# Altium schematic symbol library Minh_Lib.SchLib: 619 symbols (part 3 of 4)
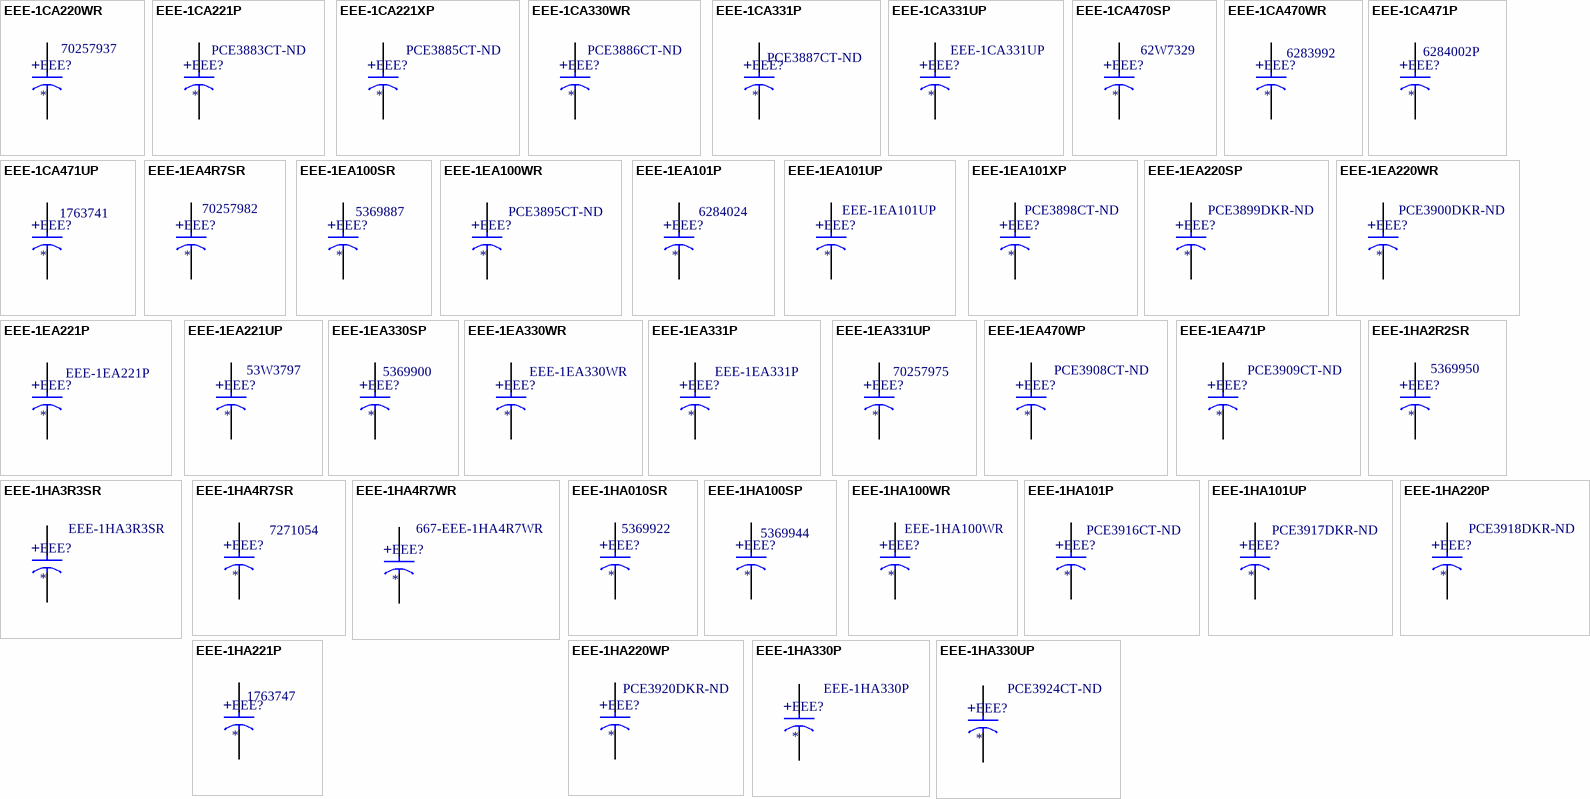
[diagram p17: symbols EEE-1CA220WR to EEE-1HA330UP]

## EEE-1EA4R7SR
designator EEE?  Supplier Part Number 1: 70257982
Aluminum Electrolytic Capacitor, 2000h 4 (Dia) x 5.4mm, 4.7uF 25 VDC, VS Series; Manufacturer: Panasonic; Manufacturer Part Number: EEE-1EA4R7SR; Dielectric Material: Aluminium; Tolerance: 20%; Voltage Rating: 25V; Ripple Current (AC): 22mA; Life (Hours): 2000Hour; Polarity: Polar; Leakage Current: 3uA; Lead Length: 1.8mm; Supplier 1: Allied Electronics; RoHS: Yes; Category: Aluminum Electrolytic Capacitors; Stock 1: 33; Pricing 1: 1=0.14000, 100=0.13300, 200=0.13000, 500=0.12600, 1000=0.12100, 2500=0.11300, 5000=0.10400 (USD); Mount: Surface Mount,PCB; Case/Package: Radial; Number of Pins: 2; Contact Plating: Tin; Min Operating Temperature: -40°C; Max Operating Temperature: 85°C; Capacitance: 4.7uF; Packaging: Tape and Reel; Voltage Rating (DC): 25V; Package Quantity: 2000; Ripple Current: 22mA; Termination: SMD/SMT; Voltage: 25V; Series: S; Construction: Cylindrical; Diameter: 4mm; Length: 5.5mm; Width: 4.3mm; Height: 5.4mm; Height - Seated (Max): 0.213inch; Lead Pitch: 1mm; Radiation Hardening: No; Lead Free: Lead Free; REACH SVHC: Unknown; RoHS Compliant: Yes; ComponentLink1URL: https://datasheet.ciiva.com/11780/0900766b8078636e-11780832.pdf?src-supplier=RSComponents; ComponentLink1Description: https://datasheet.ciiva.com/11780/0900766b8078636e-11780832.pdf?src-supplier=RSComponents; ComponentLink2URL: https://datasheet.ciiva.com/24235/aba0000ce2-40801-24235782.pdf?src-supplier=Mouser; ComponentLink2Description: https://datasheet.ciiva.com/24235/aba0000ce2-40801-24235782.pdf?src-supplier=Mouser; ComponentLink3URL: https://datasheet.ciiva.com/43485/aba0000ce2-43485610.pdf?src-supplier=Farnell; ComponentLink3Description: https://datasheet.ciiva.com/43485/aba0000ce2-43485610.pdf?src-supplier=Farnell; ComponentLink4URL: https://datasheet.ciiva.com/46387/aba0000ce2-46387975.pdf?src-supplier=Element14; ComponentLink4Description: https://datasheet.ciiva.com/46387/aba0000ce2-46387975.pdf?src-supplier=Element14; ComponentLink5URL: https://datasheet.ciiva.com/6196/aba0000ce2-6196252.pdf?src-supplier=Farnell; ComponentLink5Description: https://datasheet.ciiva.com/6196/aba0000ce2-6196252.pdf?src-supplier=Farnell; ComponentLink6URL: https://datasheet.ciiva.com/46376/aba0000ce2-46376367.pdf?src-supplier=Element14; ComponentLink6Description: https://datasheet.ciiva.com/46376/aba0000ce2-46376367.pdf?src-supplier=Element14; ComponentLink7URL: https://datasheet.ciiva.com/2985/aba0000ce2-2985141.pdf?src-supplier=Avnet; ComponentLink7Description: https://datasheet.ciiva.com/2985/aba0000ce2-2985141.pdf?src-supplier=Avnet; ComponentLink8URL: https://datasheet.ciiva.com/15166/getdatasheetpartid-199828-15166365.pdf?src-supplier=Verical; ComponentLink8Description: https://datasheet.ciiva.com/15166/getdatasheetpartid-199828-15166365.pdf?src-supplier=Verical; ComponentLink9URL: https://datasheet.ciiva.com/30114/11aba0000ce2-30114797.pdf?src-supplier=Onlinecomponents.com; ComponentLink9Description: https://datasheet.ciiva.com/30114/11aba0000ce2-30114797.pdf?src-supplier=Onlinecomponents.com; ComponentLink10URL: https://datasheet.ciiva.com/17353/aba0000ce2-17353335.pdf?src-supplier=Avnet+Europe; ComponentLink10Description: https://datasheet.ciiva.com/17353/aba0000ce2-17353335.pdf?src-supplier=Avnet+Europe
footprint CAPACITOR/ALU - SIZE B/SMD - 4X5.4 (CAPACITOR  -  ALUMINIUM - SIZE B / EEEFK - SMD)
pins: 1, 2
text: +

## EEE-1EA100SR
designator EEE?  Supplier Part Number 1: 5369887
Aluminum Electrolytic Capacitor, 2000h 5 (Dia) x 5.4mm, 10uF 25 VDC, VS Series; Manufacturer: Panasonic; Manufacturer Part Number: EEE-1EA100SR; Ripple Current: 28mA; Tolerance: 20%; Voltage Rating: 25V; Life (Hours): 2000Hour; Leakage Current: 3uA; Lead Length: 2.2mm; Supplier 1: RSComponents; RoHS: Yes; Category: Aluminum Electrolytic Capacitors; Stock 1: 1; Pricing 1: 5=0.32700, 50=0.28000, 100=0.25500, 250=0.22200, 500=0.18800 (USD); Mount: Surface Mount,PCB; Case/Package: Radial; Number of Pins: 2; Contact Plating: Tin; Min Operating Temperature: -40°C; Max Operating Temperature: 85°C; Capacitance: 10uF; Packaging: Tape and Reel; Ripple Current (AC): 28mA; Voltage Rating (DC): 25V; Package Quantity: 1; Termination: SMD/SMT; Voltage: 25V; Series: S; Construction: Cylindrical; Diameter: 5mm; Length: 5.5mm; Width: 5.3mm; Height: 5.4mm; Height - Seated (Max): 0.213inch; Lead Pitch: 1.5mm; Radiation Hardening: No; REACH SVHC: No SVHC; RoHS Compliant: Yes; ComponentLink1URL: https://datasheet.ciiva.com/11778/0900766b8078636e-11778389.pdf?src-supplier=RSComponents; ComponentLink1Description: https://datasheet.ciiva.com/11778/0900766b8078636e-11778389.pdf?src-supplier=RSComponents; ComponentLink2URL: https://datasheet.ciiva.com/24069/aba0000ce2-40801-24069004.pdf?src-supplier=Mouser; ComponentLink2Description: https://datasheet.ciiva.com/24069/aba0000ce2-40801-24069004.pdf?src-supplier=Mouser; ComponentLink3URL: https://datasheet.ciiva.com/14604/70255710-14604074.pdf?src-supplier=Allied+Electronics; ComponentLink3Description: https://datasheet.ciiva.com/14604/70255710-14604074.pdf?src-supplier=Allied+Electronics; ComponentLink4URL: https://datasheet.ciiva.com/14599/70255710-14599433.pdf?src-supplier=Allied+Electronics; ComponentLink4Description: https://datasheet.ciiva.com/14599/70255710-14599433.pdf?src-supplier=Allied+Electronics; ComponentLink5URL: https://datasheet.ciiva.com/43485/aba0000ce2-43485611.pdf?src-supplier=Farnell; ComponentLink5Description: https://datasheet.ciiva.com/43485/aba0000ce2-43485611.pdf?src-supplier=Farnell; ComponentLink6URL: https://datasheet.ciiva.com/16432/aba0000ce2-16432888.pdf?src-supplier=Future+Electronics; ComponentLink6Description: https://datasheet.ciiva.com/16432/aba0000ce2-16432888.pdf?src-supplier=Future+Electronics; ComponentLink7URL: https://datasheet.ciiva.com/2985/aba0000ce2-2985103.pdf?src-supplier=Avnet; ComponentLink7Description: https://datasheet.ciiva.com/2985/aba0000ce2-2985103.pdf?src-supplier=Avnet; ComponentLink8URL: https://datasheet.ciiva.com/30215/11aba0000ce2-30215179.pdf?src-supplier=Onlinecomponents.com; ComponentLink8Description: https://datasheet.ciiva.com/30215/11aba0000ce2-30215179.pdf?src-supplier=Onlinecomponents.com; ComponentLink9URL: https://datasheet.ciiva.com/17353/aba0000ce2-17353320.pdf?src-supplier=Avnet+Europe; ComponentLink9Description: https://datasheet.ciiva.com/17353/aba0000ce2-17353320.pdf?src-supplier=Avnet+Europe
footprint CAPACITOR/ALU - SIZE C/SMD - 5X5.4 (CAPACITOR  -  ALUMINIUM - SIZE C / EEEFK - SMD)
pins: 1, 2
text: +

## EEE-1EA100WR
designator EEE?  Supplier Part Number 1: PCE3895CT-ND
Cap Aluminum 10uF 25V 20% (4 X 5.4mm) SMD 22mA 1000 hr 85°C T/R; Manufacturer: Panasonic; Manufacturer Part Number: EEE-1EA100WR; Polarity: Polar; Life (Hours): 1000Hour; Supplier 1: Digi-Key; RoHS: Yes; Category: Aluminum Electrolytic Capacitors; Stock 1: 1; Pricing 1: 1=0.36000, 10=0.25000, 50=0.16660, 100=0.14150, 500=0.09992, 1000=0.08742 (USD); Mount: Surface Mount,PCB; Case/Package: Radial; Contact Plating: Tin; Min Operating Temperature: -40°C; Max Operating Temperature: 85°C; Capacitance: 10uF; Tolerance: 20%; Voltage Rating: 25V; Ripple Current: 22mA; Packaging: Tape and Reel; Package Quantity: 1; Voltage Rating (DC): 25V; Termination: SMD/SMT; Ripple Current (AC): 22mA; Series: S; Construction: Cylindrical; Diameter: 4mm; Length: 5.5mm; Height: 5.4mm; Height - Seated (Max): 0.213inch; Radiation Hardening: No; Lead Free: Lead Free; RoHS Compliant: Yes; REACH SVHC: Unknown; ComponentLink1URL: https://datasheet.ciiva.com/2985/aba0000ce2-2985106.pdf?src-supplier=Avnet; ComponentLink1Description: https://datasheet.ciiva.com/2985/aba0000ce2-2985106.pdf?src-supplier=Avnet; ComponentLink2URL: https://datasheet.ciiva.com/16201/aba0000ce2-16201870.pdf?src-supplier=Future+Electronics; ComponentLink2Description: https://datasheet.ciiva.com/16201/aba0000ce2-16201870.pdf?src-supplier=Future+Electronics; ComponentLink3URL: https://datasheet.ciiva.com/17536/aba0000ce2-17536886.pdf?src-supplier=Avnet+Europe; ComponentLink3Description: https://datasheet.ciiva.com/17536/aba0000ce2-17536886.pdf?src-supplier=Avnet+Europe
footprint CAPACITOR/ALU - SIZE B/SMD - 4X5.4 (CAPACITOR  -  ALUMINIUM - SIZE B / EEEFK - SMD)
pins: 1, 2
text: +

## EEE-1EA101P
designator EEE?  Supplier Part Number 1: 6284024
Cap Aluminum 100uF 25V 20% (8 X 10.2mm) SMD 180mA 2000 hr 85°C T/R; Manufacturer: Panasonic; Manufacturer Part Number: EEE-1EA101P; Life (Hours): 2000Hour; Leakage Current: 3uA; Supplier 1: RSComponents; RoHS: Yes; Category: Aluminum Electrolytic Capacitors; Stock 1: 70; Pricing 1: 5=0.68400, 25=0.48500, 375=0.31900, 1250=0.18300, 1500=0.18000, 5=0.49400, 25=0.35000, 375=0.23000, 1250=0.13200, 1500=0.13000 (USD); Mount: Surface Mount,PCB; Case/Package: Radial; Contact Plating: Tin; Min Operating Temperature: -40°C; Max Operating Temperature: 85°C; Capacitance: 100uF; Tolerance: 20%; Package Quantity: 1; Termination: SMD/SMT; Voltage Rating: 25V; Voltage Rating (DC): 25V; Ripple Current: 180mA; Packaging: Tape and Reel; Voltage: 25V; Ripple Current (AC): 180mA; Series: S; Construction: Cylindrical; Diameter: 8mm; Length: 10.5mm; Height: 10.2mm; Height - Seated (Max): 0.402inch; Radiation Hardening: No; REACH SVHC: Unknown; Lead Free: Lead Free; RoHS Compliant: Yes; ComponentLink1URL: https://datasheet.ciiva.com/11780/0900766b808a016a-11780267.pdf?src-supplier=RSComponents; ComponentLink1Description: https://datasheet.ciiva.com/11780/0900766b808a016a-11780267.pdf?src-supplier=RSComponents; ComponentLink2URL: https://datasheet.ciiva.com/14595/70255710-14595704.pdf?src-supplier=Allied+Electronics; ComponentLink2Description: https://datasheet.ciiva.com/14595/70255710-14595704.pdf?src-supplier=Allied+Electronics; ComponentLink3URL: https://datasheet.ciiva.com/14593/70255710-14593621.pdf?src-supplier=Allied+Electronics; ComponentLink3Description: https://datasheet.ciiva.com/14593/70255710-14593621.pdf?src-supplier=Allied+Electronics; ComponentLink4URL: https://datasheet.ciiva.com/16395/aba0000ce2-16395656.pdf?src-supplier=Future+Electronics; ComponentLink4Description: https://datasheet.ciiva.com/16395/aba0000ce2-16395656.pdf?src-supplier=Future+Electronics; ComponentLink5URL: https://datasheet.ciiva.com/30069/11aba0000ce2-30069578.pdf?src-supplier=Onlinecomponents.com; ComponentLink5Description: https://datasheet.ciiva.com/30069/11aba0000ce2-30069578.pdf?src-supplier=Onlinecomponents.com; ComponentLink6URL: https://datasheet.ciiva.com/17353/aba0000ce2-17353323.pdf?src-supplier=Avnet+Europe; ComponentLink6Description: https://datasheet.ciiva.com/17353/aba0000ce2-17353323.pdf?src-supplier=Avnet+Europe
footprint CAPACITOR/ALU - SIZE F/SMD - 8X10.2 (CAPACITOR  -  ALUMINIUM - SIZE F / EEEFK - SMD)
pins: 1, 2
text: +

## EEE-1EA101UP
designator EEE?  Supplier Part Number 1: EEE-1EA101UP
Cap Aluminum 100uF 25V 20% (8 X 6.2mm) SMD 91mA 2000h 85°C T/R; Manufacturer: Panasonic; Life (Hours): 2000Hour; Leakage Current: 3uA; Dissipation Factor: 0.16%; Supplier 1: Arrow Electronics; Manufacturer Part Number: EEE-1EA101UP; RoHS: Yes; Category: Aluminum Electrolytic Capacitors; Stock 1: 5; Pricing 1: 1=0.48940, 10=0.30340, 25=0.30040 (USD); Mount: Surface Mount,PCB; Case/Package: Radial; Contact Plating: Tin; Min Operating Temperature: -40°C; Max Operating Temperature: 85°C; Capacitance: 100uF; Packaging: Tape and Reel; Ripple Current: 91mA; Tolerance: 20%; Voltage Rating: 25V; Package Quantity: 1; Voltage Rating (DC): 25V; Ripple Current (AC): 91mA; Termination: SMD/SMT; Features: General Purpose; Series: S; Construction: Cylindrical; Diameter: 8mm; Length: 6.2mm; Height: 6.2mm; Height - Seated (Max): 0.244inch; Radiation Hardening: No; REACH SVHC: Unknown; Lead Free: Lead Free; RoHS Compliant: Yes; ComponentLink1URL: https://datasheet.ciiva.com/24072/aba0000ce2-40801-24072437.pdf?src-supplier=Mouser; ComponentLink1Description: https://datasheet.ciiva.com/24072/aba0000ce2-40801-24072437.pdf?src-supplier=Mouser; ComponentLink2URL: https://datasheet.ciiva.com/14606/70255710-14606463.pdf?src-supplier=Allied+Electronics; ComponentLink2Description: https://datasheet.ciiva.com/14606/70255710-14606463.pdf?src-supplier=Allied+Electronics; ComponentLink3URL: https://datasheet.ciiva.com/14598/70255710-14598959.pdf?src-supplier=Allied+Electronics; ComponentLink3Description: https://datasheet.ciiva.com/14598/70255710-14598959.pdf?src-supplier=Allied+Electronics; ComponentLink4URL: https://datasheet.ciiva.com/11680/aba0000ce2-11680591.pdf?src-supplier=Avnet; ComponentLink4Description: https://datasheet.ciiva.com/11680/aba0000ce2-11680591.pdf?src-supplier=Avnet; ComponentLink5URL: https://datasheet.ciiva.com/16507/aba0000ce2-16507708.pdf?src-supplier=Future+Electronics; ComponentLink5Description: https://datasheet.ciiva.com/16507/aba0000ce2-16507708.pdf?src-supplier=Future+Electronics; ComponentLink6URL: https://datasheet.ciiva.com/30221/11aba0000ce2-30221976.pdf?src-supplier=Onlinecomponents.com; ComponentLink6Description: https://datasheet.ciiva.com/30221/11aba0000ce2-30221976.pdf?src-supplier=Onlinecomponents.com; ComponentLink7URL: https://datasheet.ciiva.com/17535/aba0000ce2-17535819.pdf?src-supplier=Avnet+Europe; ComponentLink7Description: https://datasheet.ciiva.com/17535/aba0000ce2-17535819.pdf?src-supplier=Avnet+Europe
footprint CAPACITOR/ALU - SIZE E/SMD - 8X6.2 (CAPACITOR  -  ALUMINIUM - SIZE E / EEEFK - SMD)
pins: 1, 2
text: +

## EEE-1EA101XP
designator EEE?  Supplier Part Number 1: PCE3898CT-ND
Cap Aluminum 100uF 25V 20% (6.3 X 7.7mm) SMD 143mA 2000h 85°C T/R; Manufacturer: Panasonic; Manufacturer Part Number: EEE-1EA101XP; Polarity: Polar; Life (Hours): 2000Hour; Leakage Current: 3uA; Supplier 1: Digi-Key; RoHS: Yes; Category: Aluminum Electrolytic Capacitors; Pricing 1: 1=0.52000, 10=0.36100, 50=0.25240, 100=0.21630 (USD); Mount: Surface Mount,PCB; Case/Package: Radial; Contact Plating: Tin; Min Operating Temperature: -40°C; Max Operating Temperature: 85°C; Capacitance: 100uF; Tolerance: 20%; Voltage Rating (DC): 25V; Ripple Current: 143mA; Packaging: Tape and Reel; Voltage Rating: 25V; Package Quantity: 900; Termination: SMD/SMT; Ripple Current (AC): 143mA; Voltage: 25V; Series: S; Construction: Cylindrical; Diameter: 6.3mm; Length: 8mm; Height: 7.7mm; Height - Seated (Max): 0.303inch; Radiation Hardening: No; Lead Free: Lead Free; RoHS Compliant: Yes; REACH SVHC: Unknown; ComponentLink1URL: https://datasheet.ciiva.com/24022/aba0000ce2-40801-24022875.pdf?src-supplier=Mouser; ComponentLink1Description: https://datasheet.ciiva.com/24022/aba0000ce2-40801-24022875.pdf?src-supplier=Mouser; ComponentLink2URL: https://datasheet.ciiva.com/16201/aba0000ce2-16201065.pdf?src-supplier=Future+Electronics; ComponentLink2Description: https://datasheet.ciiva.com/16201/aba0000ce2-16201065.pdf?src-supplier=Future+Electronics; ComponentLink3URL: https://datasheet.ciiva.com/30108/11aba0000ce2-30108047.pdf?src-supplier=Onlinecomponents.com; ComponentLink3Description: https://datasheet.ciiva.com/30108/11aba0000ce2-30108047.pdf?src-supplier=Onlinecomponents.com; ComponentLink4URL: https://datasheet.ciiva.com/17529/aba0000ce2-17529557.pdf?src-supplier=Avnet+Europe; ComponentLink4Description: https://datasheet.ciiva.com/17529/aba0000ce2-17529557.pdf?src-supplier=Avnet+Europe
footprint CAPACITOR/ALU - SIZE D8/SMD - 6.3X7.7 (CAPACITOR  -  ALUMINIUM - SIZE D8 / EEEFK - SMD)
pins: 1, 2
text: +

## EEE-1EA220SP
designator EEE?  Supplier Part Number 1: PCE3899DKR-ND
Cap Aluminum 22uF 25V 20% (6.3 X 5.4mm) SMD 55mA 2000 hr 85°C T/R; Manufacturer: Panasonic; Manufacturer Part Number: EEE-1EA220SP; Dielectric Material: Aluminium; Life (Hours): 2000Hour; Leakage Current: 3uA; Lead Length: 2.6mm; Supplier 1: Digi-Key; RoHS: Yes; Category: Aluminum Electrolytic Capacitors; Pricing 1: 1=0.38000, 10=0.26400, 50=0.18520, 100=0.15870, 500=0.11902 (USD); Mount: Surface Mount,PCB; Case/Package: Radial; Number of Pins: 2; Contact Plating: Tin; Min Operating Temperature: -40°C; Max Operating Temperature: 85°C; Packaging: Tape and Reel; Capacitance: 22uF; Tolerance: 20%; Ripple Current: 55mA; Voltage Rating: 25V; Ripple Current (AC): 55mA; Voltage Rating (DC): 25V; Package Quantity: 1; Termination: SMD/SMT; Voltage: 25V; Series: S; Construction: Cylindrical; Diameter: 6.3mm; Length: 5.5mm; Width: 6.6mm; Height: 5.4mm; Height - Seated (Max): 0.213inch; Lead Pitch: 1.8mm; Radiation Hardening: No; REACH SVHC: No SVHC; Lead Free: Lead Free; RoHS Compliant: Yes; ComponentLink1URL: https://datasheet.ciiva.com/11778/0900766b8078636e-11778778.pdf?src-supplier=RSComponents; ComponentLink1Description: https://datasheet.ciiva.com/11778/0900766b8078636e-11778778.pdf?src-supplier=RSComponents; ComponentLink2URL: https://datasheet.ciiva.com/24026/aba0000ce2-40801-24026222.pdf?src-supplier=Mouser; ComponentLink2Description: https://datasheet.ciiva.com/24026/aba0000ce2-40801-24026222.pdf?src-supplier=Mouser; ComponentLink3URL: https://datasheet.ciiva.com/14594/70255710-14594571.pdf?src-supplier=Allied+Electronics; ComponentLink3Description: https://datasheet.ciiva.com/14594/70255710-14594571.pdf?src-supplier=Allied+Electronics; ComponentLink4URL: https://datasheet.ciiva.com/14600/70255710-14600425.pdf?src-supplier=Allied+Electronics; ComponentLink4Description: https://datasheet.ciiva.com/14600/70255710-14600425.pdf?src-supplier=Allied+Electronics; ComponentLink5URL: https://datasheet.ciiva.com/43485/aba0000ce2-43485612.pdf?src-supplier=Farnell; ComponentLink5Description: https://datasheet.ciiva.com/43485/aba0000ce2-43485612.pdf?src-supplier=Farnell; ComponentLink6URL: https://datasheet.ciiva.com/7903/aba0000ce2-7903178.pdf?src-supplier=Element14; ComponentLink6Description: https://datasheet.ciiva.com/7903/aba0000ce2-7903178.pdf?src-supplier=Element14; ComponentLink7URL: https://datasheet.ciiva.com/15166/getdatasheetpartid-169276-15166155.pdf?src-supplier=Verical; ComponentLink7Description: https://datasheet.ciiva.com/15166/getdatasheetpartid-169276-15166155.pdf?src-supplier=Verical; ComponentLink8URL: https://datasheet.ciiva.com/2985/aba0000ce2-2985115.pdf?src-supplier=Avnet; ComponentLink8Description: https://datasheet.ciiva.com/2985/aba0000ce2-2985115.pdf?src-supplier=Avnet; ComponentLink9URL: https://datasheet.ciiva.com/17353/aba0000ce2-17353325.pdf?src-supplier=Avnet+Europe; ComponentLink9Description: https://datasheet.ciiva.com/17353/aba0000ce2-17353325.pdf?src-supplier=Avnet+Europe
footprint CAPACITOR/ALU - SIZE D/SMD - 6.3X5.4 (CAPACITOR  -  ALUMINIUM - SIZE D / EEEFK - SMD)
pins: 1, 2
text: +

## EEE-1EA220WR
designator EEE?  Supplier Part Number 1: PCE3900DKR-ND
Cap Aluminum 22uF 25V 20% (5 X 5.4mm) SMD 35mA 1000h 85°C T/R; Manufacturer: Panasonic; Manufacturer Part Number: EEE-1EA220WR; Leakage Current: 3uA; Life (Hours): 1000Hour; Supplier 1: Digi-Key; RoHS: Yes; Category: Aluminum Electrolytic Capacitors; Pricing 1: 1=0.35000, 10=0.24400, 50=0.17060, 100=0.14630, 500=0.10972 (USD); Mount: Surface Mount,PCB; Case/Package: Radial; Contact Plating: Tin; Min Operating Temperature: -40°C; Max Operating Temperature: 85°C; Capacitance: 22uF; Tolerance: 20%; Voltage Rating (DC): 25V; Packaging: Tape and Reel; Package Quantity: 1; Voltage Rating: 25V; Ripple Current: 35mA; Ripple Current (AC): 35mA; Termination: SMD/SMT; Voltage: 25V; Series: S; Construction: Cylindrical; Diameter: 5mm; Length: 5.5mm; Height: 5.4mm; Height - Seated (Max): 0.213inch; Radiation Hardening: No; REACH SVHC: No SVHC; Lead Free: Lead Free; RoHS Compliant: Yes; ComponentLink1URL: https://datasheet.ciiva.com/43470/aba0000ce2-43470652.pdf?src-supplier=Farnell; ComponentLink1Description: https://datasheet.ciiva.com/43470/aba0000ce2-43470652.pdf?src-supplier=Farnell; ComponentLink2URL: https://datasheet.ciiva.com/46378/aba0000ce2-46378298.pdf?src-supplier=Element14; ComponentLink2Description: https://datasheet.ciiva.com/46378/aba0000ce2-46378298.pdf?src-supplier=Element14; ComponentLink3URL: https://datasheet.ciiva.com/46374/aba0000ce2-46374396.pdf?src-supplier=Element14; ComponentLink3Description: https://datasheet.ciiva.com/46374/aba0000ce2-46374396.pdf?src-supplier=Element14; ComponentLink4URL: https://datasheet.ciiva.com/14597/70255710-14597294.pdf?src-supplier=Allied+Electronics; ComponentLink4Description: https://datasheet.ciiva.com/14597/70255710-14597294.pdf?src-supplier=Allied+Electronics; ComponentLink5URL: https://datasheet.ciiva.com/11681/aba0000ce2-11681019.pdf?src-supplier=Avnet; ComponentLink5Description: https://datasheet.ciiva.com/11681/aba0000ce2-11681019.pdf?src-supplier=Avnet; ComponentLink6URL: https://datasheet.ciiva.com/16432/aba0000ce2-16432889.pdf?src-supplier=Future+Electronics; ComponentLink6Description: https://datasheet.ciiva.com/16432/aba0000ce2-16432889.pdf?src-supplier=Future+Electronics; ComponentLink7URL: https://datasheet.ciiva.com/17353/aba0000ce2-17353327.pdf?src-supplier=Avnet+Europe; ComponentLink7Description: https://datasheet.ciiva.com/17353/aba0000ce2-17353327.pdf?src-supplier=Avnet+Europe; ComponentLink8URL: https://datasheet.ciiva.com/16539/aba0000ce2-16539941.pdf?src-supplier=Avnet+Asia; ComponentLink8Description: https://datasheet.ciiva.com/16539/aba0000ce2-16539941.pdf?src-supplier=Avnet+Asia
footprint CAPACITOR/ALU - SIZE C/SMD - 5X5.4 (CAPACITOR  -  ALUMINIUM - SIZE C / EEEFK - SMD)
pins: 1, 2
text: +

## EEE-1EA221P
designator EEE?  Supplier Part Number 1: EEE-1EA221P
Cap Aluminum 220uF 25V 20% (10 X 10.2mm) SMD 310mA 2000h 85 T/R; Manufacturer: Panasonic; Dielectric Material: Aluminium; Life (Hours): 2000Hour; Leakage Current: 55uA; Supplier 1: Arrow Electronics; Manufacturer Part Number: EEE-1EA221P; RoHS: Yes; Category: Aluminum Electrolytic Capacitors; Stock 1: 16; Pricing 1: 1=0.61300, 10=0.39480 (USD); Mount: Surface Mount,PCB; Case/Package: Radial; Contact Plating: Tin; Min Operating Temperature: -40°C; Max Operating Temperature: 85°C; Capacitance: 220uF; Voltage Rating: 25V; Tolerance: 20%; Ripple Current: 310mA; Packaging: Tape and Reel; Package Quantity: 1; Voltage Rating (DC): 25V; Termination: SMD/SMT; Ripple Current (AC): 310mA; Voltage: 25V; Series: S; Construction: Cylindrical; Diameter: 10mm; Length: 10.5mm; Height: 10.2mm; Height - Seated (Max): 0.402inch; Radiation Hardening: No; Lead Free: Lead Free; RoHS Compliant: Yes; REACH SVHC: Unknown; ComponentLink1URL: https://datasheet.ciiva.com/30070/aba0000ce2-30070192.pdf?src-supplier=Onlinecomponents.com; ComponentLink1Description: https://datasheet.ciiva.com/30070/aba0000ce2-30070192.pdf?src-supplier=Onlinecomponents.com; ComponentLink2URL: https://datasheet.ciiva.com/24071/aba0000ce2-40801-24071546.pdf?src-supplier=Mouser; ComponentLink2Description: https://datasheet.ciiva.com/24071/aba0000ce2-40801-24071546.pdf?src-supplier=Mouser; ComponentLink3URL: https://datasheet.ciiva.com/43470/aba0000ce2-43470653.pdf?src-supplier=Farnell; ComponentLink3Description: https://datasheet.ciiva.com/43470/aba0000ce2-43470653.pdf?src-supplier=Farnell; ComponentLink4URL: https://datasheet.ciiva.com/14605/70255710-14605518.pdf?src-supplier=Allied+Electronics; ComponentLink4Description: https://datasheet.ciiva.com/14605/70255710-14605518.pdf?src-supplier=Allied+Electronics; ComponentLink5URL: https://datasheet.ciiva.com/46378/aba0000ce2-46378297.pdf?src-supplier=Element14; ComponentLink5Description: https://datasheet.ciiva.com/46378/aba0000ce2-46378297.pdf?src-supplier=Element14; ComponentLink6URL: https://datasheet.ciiva.com/14602/70255710-14602427.pdf?src-supplier=Allied+Electronics; ComponentLink6Description: https://datasheet.ciiva.com/14602/70255710-14602427.pdf?src-supplier=Allied+Electronics; ComponentLink7URL: https://datasheet.ciiva.com/46374/aba0000ce2-46374395.pdf?src-supplier=Element14; ComponentLink7Description: https://datasheet.ciiva.com/46374/aba0000ce2-46374395.pdf?src-supplier=Element14; ComponentLink8URL: https://datasheet.ciiva.com/2985/aba0000ce2-2985119.pdf?src-supplier=Avnet; ComponentLink8Description: https://datasheet.ciiva.com/2985/aba0000ce2-2985119.pdf?src-supplier=Avnet; ComponentLink9URL: https://datasheet.ciiva.com/31414/aba0000ce2-31414661.pdf?src-supplier=Farnell; ComponentLink9Description: https://datasheet.ciiva.com/31414/aba0000ce2-31414661.pdf?src-supplier=Farnell
footprint CAPACITOR/ALU - SIZE G/SMD - 10X10.2 (CAPACITOR  -  ALUMINIUM - SIZE G / EEEFK - SMD)
pins: 1, 2
text: +

## EEE-1EA221UP
designator EEE?  Supplier Part Number 1: 53W3797
Cap Aluminum 220uF 25V 20% (8 X 10.2mm) SMD 230mA 2000h 85°C T/R; Manufacturer: Panasonic; Manufacturer Part Number: EEE-1EA221UP; Leakage Current: 3uA; Life (Hours): 2000Hour; Supplier 1: Newark; RoHS: Yes; Category: Aluminum Electrolytic Capacitors; Stock 1: 36; Pricing 1: 1=0.76200, 10=0.54900, 25=0.48900, 50=0.42900, 100=0.36900 (USD); Mount: Surface Mount,PCB; Case/Package: Radial; Contact Plating: Tin; Min Operating Temperature: -40°C; Max Operating Temperature: 85°C; Capacitance: 220uF; Tolerance: 20%; Ripple Current: 230mA; Packaging: Tape and Reel; Voltage Rating: 25V; Voltage Rating (DC): 25V; Package Quantity: 1; Ripple Current (AC): 230mA; Termination: SMD/SMT; Voltage: 25V; Series: S; Construction: Cylindrical; Diameter: 8mm; Length: 10.5mm; Height: 10.2mm; Height - Seated (Max): 0.402inch; Radiation Hardening: No; REACH SVHC: Unknown; Lead Free: Lead Free; RoHS Compliant: Yes; ComponentLink1URL: https://datasheet.ciiva.com/14595/70255710-14595429.pdf?src-supplier=Allied+Electronics; ComponentLink1Description: https://datasheet.ciiva.com/14595/70255710-14595429.pdf?src-supplier=Allied+Electronics; ComponentLink2URL: https://datasheet.ciiva.com/14609/70255710-14609039.pdf?src-supplier=Allied+Electronics; ComponentLink2Description: https://datasheet.ciiva.com/14609/70255710-14609039.pdf?src-supplier=Allied+Electronics; ComponentLink3URL: https://datasheet.ciiva.com/10331/aba0000ce2-10331004.pdf?src-supplier=Avnet; ComponentLink3Description: https://datasheet.ciiva.com/10331/aba0000ce2-10331004.pdf?src-supplier=Avnet; ComponentLink4URL: https://datasheet.ciiva.com/15166/getdatasheetpartid-178441-15166199.pdf?src-supplier=Verical; ComponentLink4Description: https://datasheet.ciiva.com/15166/getdatasheetpartid-178441-15166199.pdf?src-supplier=Verical; ComponentLink5URL: https://datasheet.ciiva.com/2985/aba0000ce2-2985122.pdf?src-supplier=Avnet; ComponentLink5Description: https://datasheet.ciiva.com/2985/aba0000ce2-2985122.pdf?src-supplier=Avnet; ComponentLink6URL: https://datasheet.ciiva.com/30176/11aba0000ce2-30176345.pdf?src-supplier=Onlinecomponents.com; ComponentLink6Description: https://datasheet.ciiva.com/30176/11aba0000ce2-30176345.pdf?src-supplier=Onlinecomponents.com
footprint CAPACITOR/ALU - SIZE F/SMD - 8X10.2 (CAPACITOR  -  ALUMINIUM - SIZE F / EEEFK - SMD)
pins: 1, 2
text: +

## EEE-1EA330SP
designator EEE?  Supplier Part Number 1: 5369900
Cap Aluminum 33uF 25V 20% (6.3 X 5.4mm) SMD 65mA 2000h 85 C T/R; Manufacturer: Panasonic; Manufacturer Part Number: EEE-1EA330SP; Dielectric Material: Aluminium; Life (Hours): 2000Hour; Leakage Current: 3uA; Lead Length: 2.6mm; Supplier 1: RSComponents; RoHS: Yes; Category: Aluminum Electrolytic Capacitors; Stock 1: 430; Pricing 1: 5=0.36000, 50=0.26000, 250=0.15000, 500=0.11600, 2500=0.08000, 5=0.26000, 50=0.18800, 250=0.10800, 500=0.08400, 2500=0.05800 (USD); Mount: Surface Mount,PCB; Case/Package: Radial; Number of Pins: 2; Contact Plating: Tin; Min Operating Temperature: -40°C; Max Operating Temperature: 85°C; Capacitance: 33uF; Voltage Rating: 25V; Tolerance: 20%; Ripple Current: 65mA; Packaging: Tape and Reel; Package Quantity: 1; Voltage Rating (DC): 25V; Ripple Current (AC): 65mA; Termination: SMD/SMT; Voltage: 25V; Series: S; Construction: Cylindrical; Diameter: 6.3mm; Length: 5.5mm; Width: 6.6mm; Height: 5.4mm; Height - Seated (Max): 0.213inch; Lead Pitch: 1.8mm; Radiation Hardening: No; REACH SVHC: No SVHC; Lead Free: Lead Free; RoHS Compliant: Yes; ComponentLink1URL: https://datasheet.ciiva.com/11779/0900766b8078636e-11779225.pdf?src-supplier=RSComponents; ComponentLink1Description: https://datasheet.ciiva.com/11779/0900766b8078636e-11779225.pdf?src-supplier=RSComponents; ComponentLink2URL: https://datasheet.ciiva.com/28678/aba0000ce2-28678808.pdf?src-supplier=Element14; ComponentLink2Description: https://datasheet.ciiva.com/28678/aba0000ce2-28678808.pdf?src-supplier=Element14; ComponentLink3URL: https://datasheet.ciiva.com/24027/aba0000ce2-40801-24027482.pdf?src-supplier=Mouser; ComponentLink3Description: https://datasheet.ciiva.com/24027/aba0000ce2-40801-24027482.pdf?src-supplier=Mouser; ComponentLink4URL: https://datasheet.ciiva.com/14599/70255710-14599030.pdf?src-supplier=Allied+Electronics; ComponentLink4Description: https://datasheet.ciiva.com/14599/70255710-14599030.pdf?src-supplier=Allied+Electronics; ComponentLink5URL: https://datasheet.ciiva.com/43485/aba0000ce2-43485613.pdf?src-supplier=Farnell; ComponentLink5Description: https://datasheet.ciiva.com/43485/aba0000ce2-43485613.pdf?src-supplier=Farnell; ComponentLink6URL: https://datasheet.ciiva.com/46387/aba0000ce2-46387973.pdf?src-supplier=Element14; ComponentLink6Description: https://datasheet.ciiva.com/46387/aba0000ce2-46387973.pdf?src-supplier=Element14; ComponentLink7URL: https://datasheet.ciiva.com/6012/aba0000ce2-6012728.pdf?src-supplier=Farnell; ComponentLink7Description: https://datasheet.ciiva.com/6012/aba0000ce2-6012728.pdf?src-supplier=Farnell; ComponentLink8URL: https://datasheet.ciiva.com/2985/aba0000ce2-2985125.pdf?src-supplier=Avnet; ComponentLink8Description: https://datasheet.ciiva.com/2985/aba0000ce2-2985125.pdf?src-supplier=Avnet; ComponentLink9URL: https://datasheet.ciiva.com/16396/aba0000ce2-16396863.pdf?src-supplier=Future+Electronics; ComponentLink9Description: https://datasheet.ciiva.com/16396/aba0000ce2-16396863.pdf?src-supplier=Future+Electronics; ComponentLink10URL: https://datasheet.ciiva.com/15166/getdatasheetpartid-191538-15166317.pdf?src-supplier=Verical; ComponentLink10Description: https://datasheet.ciiva.com/15166/getdatasheetpartid-191538-15166317.pdf?src-supplier=Verical; ComponentLink11URL: https://datasheet.ciiva.com/30152/11aba0000ce2-30152879.pdf?src-supplier=Onlinecomponents.com; ComponentLink11Description: https://datasheet.ciiva.com/30152/11aba0000ce2-30152879.pdf?src-supplier=Onlinecomponents.com; ComponentLink12URL: https://datasheet.ciiva.com/17353/aba0000ce2-17353333.pdf?src-supplier=Avnet+Europe; ComponentLink12Description: https://datasheet.ciiva.com/17353/aba0000ce2-17353333.pdf?src-supplier=Avnet+Europe; ComponentLink13URL: https://datasheet.ciiva.com/16539/aba0000ce2-16539943.pdf?src-supplier=Avnet+Asia; ComponentLink13Description: https://datasheet.ciiva.com/16539/aba0000ce2-16539943.pdf?src-supplier=Avnet+Asia
footprint CAPACITOR/ALU - SIZE D/SMD - 6.3X5.4 (CAPACITOR  -  ALUMINIUM - SIZE D / EEEFK - SMD)
pins: 1, 2
text: +

## EEE-1EA330WR
designator EEE?  Supplier Part Number 1: EEE-1EA330WR
Cap Aluminum 33uF 25V 20% (5 X 5.4mm) SMD 42mA 1000 hr 85°C T/R; Manufacturer: Panasonic; Dielectric Material: Aluminium; Life (Hours): 1000Hour; Leakage Current: 8.2uA; Polarity: Polar; Supplier 1: Arrow Electronics; Manufacturer Part Number: EEE-1EA330WR; RoHS: Yes; Category: Aluminum Electrolytic Capacitors; Stock 1: 20; Pricing 1: 1=0.30350, 10=0.21690 (USD); Mount: Surface Mount,PCB; Case/Package: Radial; Min Operating Temperature: -40°C; Max Operating Temperature: 85°C; Capacitance: 33uF; Packaging: Tape and Reel; Ripple Current: 42mA; Tolerance: 20%; Voltage Rating: 25V; Package Quantity: 1000; Termination: SMD/SMT; Voltage Rating (DC): 25V; Ripple Current (AC): 42mA; Voltage: 25V; Series: S; Construction: Cylindrical; Diameter: 5mm; Length: 5.5mm; Height: 5.4mm; Height - Seated (Max): 0.213inch; Radiation Hardening: No; REACH SVHC: No SVHC; Lead Free: Lead Free; RoHS Compliant: Yes; ComponentLink1URL: https://datasheet.ciiva.com/43470/aba0000ce2-43470655.pdf?src-supplier=Farnell; ComponentLink1Description: https://datasheet.ciiva.com/43470/aba0000ce2-43470655.pdf?src-supplier=Farnell; ComponentLink2URL: https://datasheet.ciiva.com/46378/aba0000ce2-46378295.pdf?src-supplier=Element14; ComponentLink2Description: https://datasheet.ciiva.com/46378/aba0000ce2-46378295.pdf?src-supplier=Element14; ComponentLink3URL: https://datasheet.ciiva.com/31414/aba0000ce2-31414663.pdf?src-supplier=Farnell; ComponentLink3Description: https://datasheet.ciiva.com/31414/aba0000ce2-31414663.pdf?src-supplier=Farnell; ComponentLink4URL: https://datasheet.ciiva.com/46374/aba0000ce2-46374393.pdf?src-supplier=Element14; ComponentLink4Description: https://datasheet.ciiva.com/46374/aba0000ce2-46374393.pdf?src-supplier=Element14; ComponentLink5URL: https://datasheet.ciiva.com/24027/aba0000ce2-40801-24027319.pdf?src-supplier=Mouser; ComponentLink5Description: https://datasheet.ciiva.com/24027/aba0000ce2-40801-24027319.pdf?src-supplier=Mouser; ComponentLink6URL: https://datasheet.ciiva.com/14605/70255710-14605574.pdf?src-supplier=Allied+Electronics; ComponentLink6Description: https://datasheet.ciiva.com/14605/70255710-14605574.pdf?src-supplier=Allied+Electronics; ComponentLink7URL: https://datasheet.ciiva.com/14603/70255710-14603753.pdf?src-supplier=Allied+Electronics; ComponentLink7Description: https://datasheet.ciiva.com/14603/70255710-14603753.pdf?src-supplier=Allied+Electronics; ComponentLink8URL: https://datasheet.ciiva.com/2985/aba0000ce2-2985128.pdf?src-supplier=Avnet; ComponentLink8Description: https://datasheet.ciiva.com/2985/aba0000ce2-2985128.pdf?src-supplier=Avnet; ComponentLink9URL: https://datasheet.ciiva.com/17076/aba0000ce2-17076760.pdf?src-supplier=Future+Electronics; ComponentLink9Description: https://datasheet.ciiva.com/17076/aba0000ce2-17076760.pdf?src-supplier=Future+Electronics; ComponentLink10URL: https://datasheet.ciiva.com/2985/aba0000ce2-2985129.pdf?src-supplier=Avnet; ComponentLink10Description: https://datasheet.ciiva.com/2985/aba0000ce2-2985129.pdf?src-supplier=Avnet; ComponentLink11URL: https://datasheet.ciiva.com/30071/11aba0000ce2-30071998.pdf?src-supplier=Onlinecomponents.com; ComponentLink11Description: https://datasheet.ciiva.com/30071/11aba0000ce2-30071998.pdf?src-supplier=Onlinecomponents.com; ComponentLink12URL: https://datasheet.ciiva.com/17536/aba0000ce2-17536502.pdf?src-supplier=Avnet+Europe; ComponentLink12Description: https://datasheet.ciiva.com/17536/aba0000ce2-17536502.pdf?src-supplier=Avnet+Europe
footprint CAPACITOR/ALU - SIZE C/SMD - 5X5.4 (CAPACITOR  -  ALUMINIUM - SIZE C / EEEFK - SMD)
pins: 1, 2
text: +

## EEE-1EA331P
designator EEE?  Supplier Part Number 1: EEE-1EA331P
Cap Aluminum 330uF 25V 20% (10 X 10.2mm) SMD 340mA 2000 hr 85°C T/R; Manufacturer: Panasonic; Life (Hours): 2000Hour; Leakage Current: 3uA; Supplier 1: Arrow Electronics; Manufacturer Part Number: EEE-1EA331P; RoHS: Yes; Category: Aluminum Electrolytic Capacitors; Stock 1: 63; Pricing 1: 1=0.66060, 10=0.47160, 25=0.46720 (USD); Mount: Surface Mount,PCB; Case/Package: Radial; Min Operating Temperature: -40°C; Max Operating Temperature: 85°C; Capacitance: 330uF; Voltage Rating: 25V; Tolerance: 20%; Ripple Current: 340mA; Packaging: Tape and Reel; Package Quantity: 500; Voltage Rating (DC): 25V; Termination: SMD/SMT; Ripple Current (AC): 340mA; Voltage: 25V; Series: S; Construction: Cylindrical; Diameter: 10mm; Length: 10.5mm; Height: 10.2mm; Height - Seated (Max): 0.402inch; Radiation Hardening: No; Lead Free: Lead Free; RoHS Compliant: Yes; REACH SVHC: Unknown; ComponentLink1URL: https://datasheet.ciiva.com/2985/aba0000ce2-2985130.pdf?src-supplier=Avnet; ComponentLink1Description: https://datasheet.ciiva.com/2985/aba0000ce2-2985130.pdf?src-supplier=Avnet; ComponentLink2URL: https://datasheet.ciiva.com/14601/70255710-14601130.pdf?src-supplier=Allied+Electronics; ComponentLink2Description: https://datasheet.ciiva.com/14601/70255710-14601130.pdf?src-supplier=Allied+Electronics; ComponentLink3URL: https://datasheet.ciiva.com/17534/aba0000ce2-17534572.pdf?src-supplier=Avnet+Europe; ComponentLink3Description: https://datasheet.ciiva.com/17534/aba0000ce2-17534572.pdf?src-supplier=Avnet+Europe; ComponentLink4URL: https://datasheet.ciiva.com/14609/70255710-14609341.pdf?src-supplier=Allied+Electronics; ComponentLink4Description: https://datasheet.ciiva.com/14609/70255710-14609341.pdf?src-supplier=Allied+Electronics
footprint CAPACITOR/ALU - SIZE G/SMD - 10X10.2 (CAPACITOR  -  ALUMINIUM - SIZE G / EEEFK - SMD)
pins: 1, 2
text: +

## EEE-1EA331UP
designator EEE?  Supplier Part Number 1: 70257975
Cap Aluminum 330uF 25V 20% (8 X 10.2mm) SMD 270mA 2000 hr 85°C T/R; Manufacturer: Panasonic; Manufacturer Part Number: EEE-1EA331UP; Life (Hours): 2000Hour; Leakage Current: 3uA; Supplier 1: Allied Electronics; RoHS: Yes; Category: Aluminum Electrolytic Capacitors; Stock 1: 2; Pricing 1: 1=0.42700, 50=0.41900, 100=0.40700, 500=0.38900 (USD); Mount: Surface Mount,PCB; Case/Package: Radial; Contact Plating: Tin; Min Operating Temperature: -40°C; Max Operating Temperature: 85°C; Capacitance: 330uF; Tolerance: 20%; Voltage Rating: 25V; Ripple Current: 270mA; Packaging: Tape and Reel; Package Quantity: 1; Voltage Rating (DC): 25V; Termination: SMD/SMT; Series: S; Ripple Current (AC): 270mA; Voltage: 25V; Construction: Cylindrical; Diameter: 8mm; Length: 10.5mm; Height: 10.2mm; Height - Seated (Max): 0.402inch; Radiation Hardening: No; REACH SVHC: No SVHC; Lead Free: Lead Free; RoHS Compliant: Yes; ComponentLink1URL: https://datasheet.ciiva.com/46378/aba0000ce2-46378294.pdf?src-supplier=Element14; ComponentLink1Description: https://datasheet.ciiva.com/46378/aba0000ce2-46378294.pdf?src-supplier=Element14; ComponentLink2URL: https://datasheet.ciiva.com/31414/aba0000ce2-31414664.pdf?src-supplier=Farnell; ComponentLink2Description: https://datasheet.ciiva.com/31414/aba0000ce2-31414664.pdf?src-supplier=Farnell; ComponentLink3URL: https://datasheet.ciiva.com/46374/aba0000ce2-46374392.pdf?src-supplier=Element14; ComponentLink3Description: https://datasheet.ciiva.com/46374/aba0000ce2-46374392.pdf?src-supplier=Element14; ComponentLink4URL: https://datasheet.ciiva.com/24070/aba0000ce2-40801-24070005.pdf?src-supplier=Mouser; ComponentLink4Description: https://datasheet.ciiva.com/24070/aba0000ce2-40801-24070005.pdf?src-supplier=Mouser; ComponentLink5URL: https://datasheet.ciiva.com/14610/70255710-14610287.pdf?src-supplier=Allied+Electronics; ComponentLink5Description: https://datasheet.ciiva.com/14610/70255710-14610287.pdf?src-supplier=Allied+Electronics; ComponentLink6URL: https://datasheet.ciiva.com/2985/aba0000ce2-2985133.pdf?src-supplier=Avnet; ComponentLink6Description: https://datasheet.ciiva.com/2985/aba0000ce2-2985133.pdf?src-supplier=Avnet; ComponentLink7URL: https://datasheet.ciiva.com/16397/aba0000ce2-16397068.pdf?src-supplier=Future+Electronics; ComponentLink7Description: https://datasheet.ciiva.com/16397/aba0000ce2-16397068.pdf?src-supplier=Future+Electronics; ComponentLink8URL: https://datasheet.ciiva.com/30071/11aba0000ce2-30071959.pdf?src-supplier=Onlinecomponents.com; ComponentLink8Description: https://datasheet.ciiva.com/30071/11aba0000ce2-30071959.pdf?src-supplier=Onlinecomponents.com; ComponentLink9URL: https://datasheet.ciiva.com/17535/aba0000ce2-17535308.pdf?src-supplier=Avnet+Europe; ComponentLink9Description: https://datasheet.ciiva.com/17535/aba0000ce2-17535308.pdf?src-supplier=Avnet+Europe
footprint CAPACITOR/ALU - SIZE F/SMD - 8X10.2 (CAPACITOR  -  ALUMINIUM - SIZE F / EEEFK - SMD)
pins: 1, 2
text: +
